# Altium footprint library PcbLib.PcbLib: 79 footprints (part 4 of 5)
Each footprint in its own frame and in the unit in brackets; x right, y up, seen from the top. Pads: shape width x height; smd on the part's side, far side on the other; paste and mask are expansions set on the pad; w line width, h text height; cw(c..) or ccw(c..) is an arc to the next point about the centre after c.
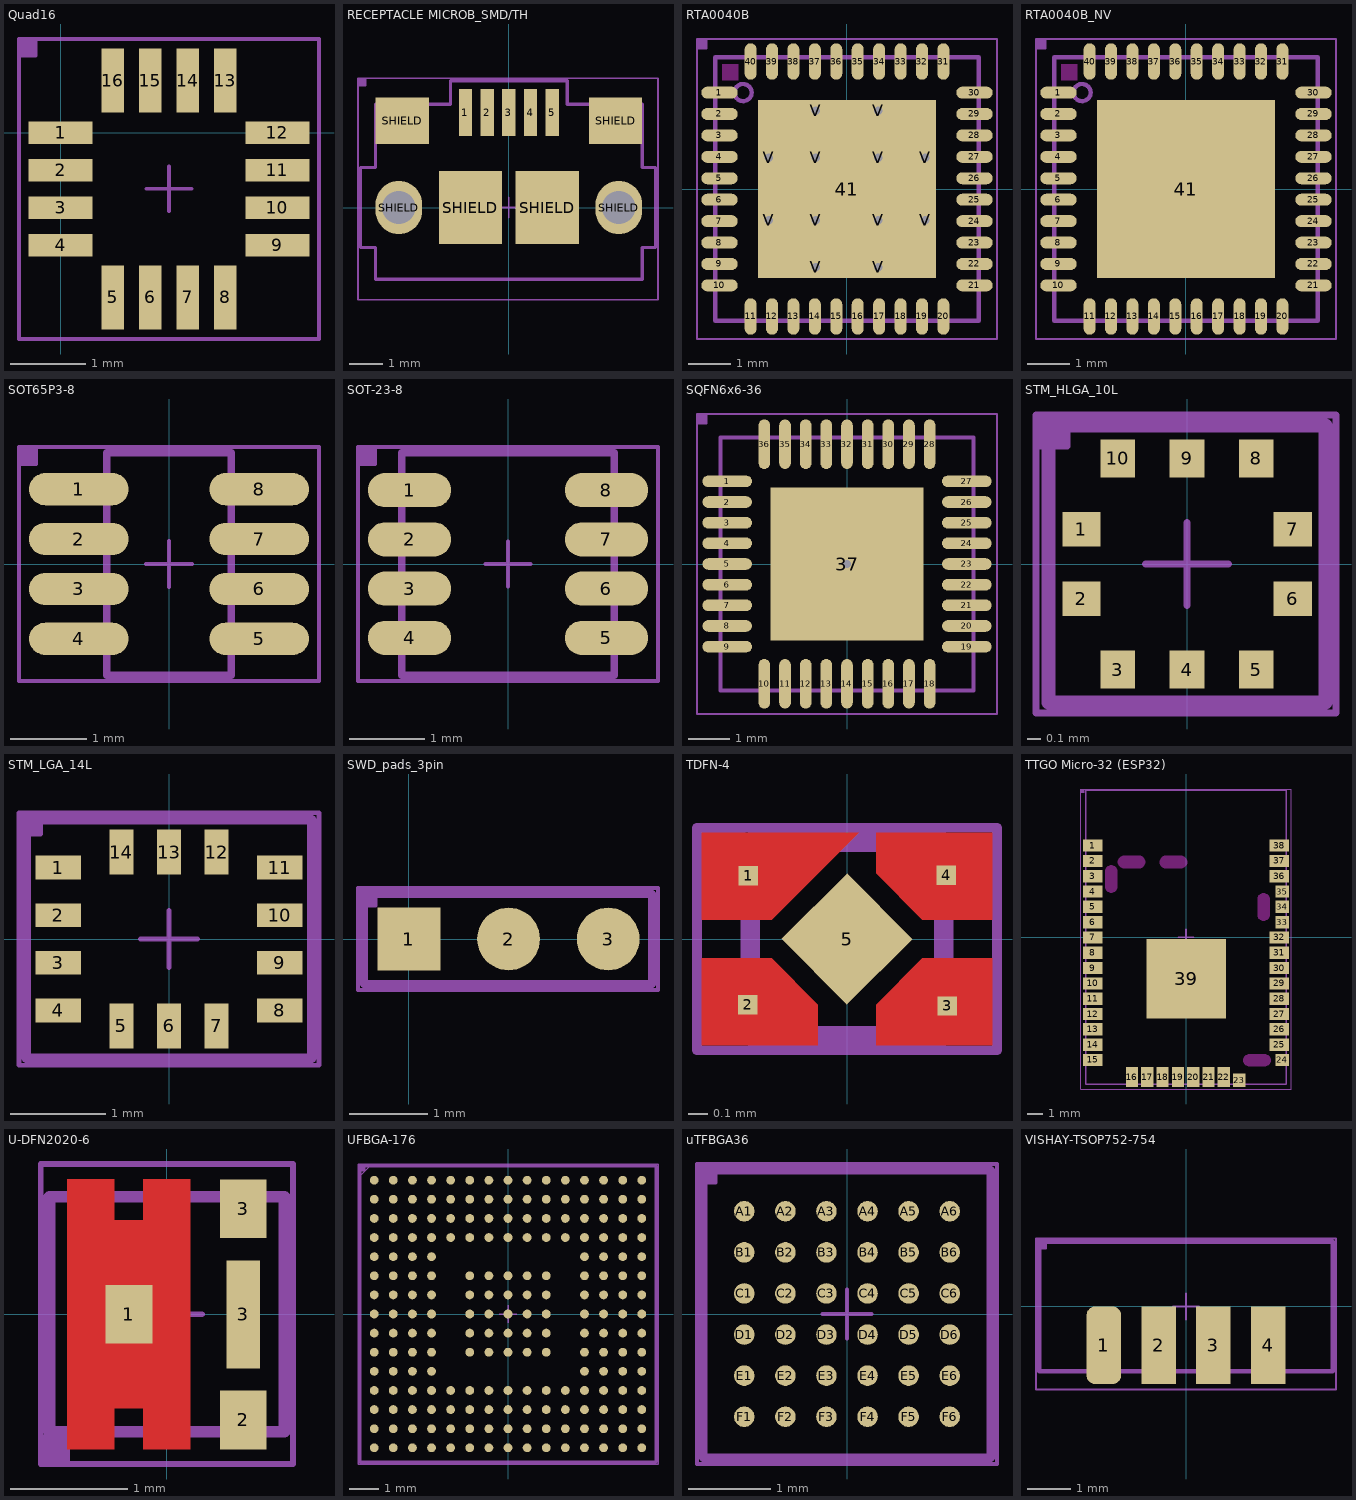
[diagram p3: the footprints below, top view; thin cyan lines are the x and y axes]

## Quad16 [mm]
pads (16):
  rect 0.85x0.3 smd: 1(0,0) 2(0,-0.5) 3(0,-1) 4(0,-1.5) 9(2.9,-1.5) 10(2.9,-1) 11(2.9,-0.5) 12(2.9,0)
  rect 0.3x0.85 smd: 5(0.7,-2.2) 6(1.2,-2.2) 7(1.7,-2.2) 8(2.2,-2.2) 13(2.2,0.7) 14(1.7,0.7) 15(1.2,0.7) 16(0.7,0.7)
TopCourtyard:
  region: -0.555,1.255 -0.555,1.03 -0.33,1.03 -0.33,1.255
  lines w0.05: -0.555,1.03 -0.33,1.03 -0.33,1.255 ; 1.15,-0.745 1.75,-0.745 ; 1.45,-1.045 1.45,-0.445 ; -0.555,-2.755 -0.555,1.255 3.455,1.255 3.455,-2.755 -0.555,-2.755

## RECEPTACLE MICROB_SMD/TH [mm]
pads (11):
  rect 0.4x1.4 smd paste+0 mask+0.05: 1(-1.3,2.85) 2(-0.65,2.85) 3(0,2.85) 4(0.65,2.85) 5(1.3,2.85)
  oval 1.4x1.6 hole 1 paste-1 mask+0.1: SHIELD(-3.3,0) SHIELD(3.3,0)
  rect 1.6x1.4 smd paste+0 mask+0.05: SHIELD(-3.2,2.6) SHIELD(3.2,2.6)
  rect 1.9x2.2 smd paste+0 mask-0.1: SHIELD(-1.15,0) SHIELD(1.15,0)
TopBody:
  lines w0.1: -4.45,-1.2 -4,-1.2 -4,-2.15 4,-2.15 4,-1.2 4.4,-1.2 4.4,1.2 4,1.2 4,3.1 1.75,3.1 1.75,3.8 -1.75,3.8 -1.75,3.1 -4,3.1 -4,1.2 -4.45,1.2 -4.45,-1.2
TopCourtyard:
  region: -4.525,3.875 -4.525,3.65 -4.3,3.65 -4.3,3.875
  lines w0.05: -4.525,3.65 -4.3,3.65 -4.3,3.875 ; -0.3,0 0.3,0 ; 0,-0.3 0,0.3 ; -4.525,-2.765 4.475,-2.765 4.475,3.875 -4.525,3.875 -4.525,-2.765
3D body "10118193-0001lfc.stp": height 3.13, standoff -0.76, extent -4,-2.739 3.857,3.103

## RTA0040B [mm]
pads (53):
  oval 0.85x0.28 smd paste-0.025 mask+0.07: 1(-2.975,2.25) 2(-2.975,1.75) 3(-2.975,1.25) 4(-2.975,0.75) 5(-2.975,0.25) 6(-2.975,-0.25) 7(-2.975,-0.75) 8(-2.975,-1.25) 9(-2.975,-1.75) 10(-2.975,-2.25) 21(2.975,-2.25) 22(2.975,-1.75) 23(2.975,-1.25) 24(2.975,-0.75) 25(2.975,-0.25) 26(2.975,0.25) 27(2.975,0.75) 28(2.975,1.25) 29(2.975,1.75) 30(2.975,2.25)
  oval 0.28x0.85 smd paste-0.025 mask+0.07: 11(-2.25,-2.975) 12(-1.75,-2.975) 13(-1.25,-2.975) 14(-0.75,-2.975) 15(-0.25,-2.975) 16(0.25,-2.975) 17(0.75,-2.975) 18(1.25,-2.975) 19(1.75,-2.975) 20(2.25,-2.975) 31(2.25,2.975) 32(1.75,2.975) 33(1.25,2.975) 34(0.75,2.975) 35(0.25,2.975) 36(-0.25,2.975) 37(-0.75,2.975) 38(-1.25,2.975) 39(-1.75,2.975) 40(-2.25,2.975)
  rect 4.15x4.15 smd paste-2.08 mask+0: 41(0,0)
  round 0.5 hole 0.2 mask+0: V(-1.825,-0.725) V(-1.825,0.725) V(-0.725,-1.825) V(-0.725,-0.725) V(-0.725,0.725) V(-0.725,1.825) V(0.725,-1.825) V(0.725,-0.725) V(0.725,0.725) V(0.725,1.825) V(1.825,-0.725) V(1.825,0.725)
Top Layer keep-out:
  rectangle: -2.918,2.535 -2.535,2.918
Top Paste:
  region: -2.025,0.575 -2.025,-0.575 -0.875,-0.575 -0.875,0.575
  region: -2.025,-0.875 -2.025,-2.025 -0.875,-2.025 -0.875,-0.875
  region: -2.025,2.025 -2.025,0.875 -0.875,0.875 -0.875,2.025
  region: 0.875,0.575 0.875,-0.575 2.025,-0.575 2.025,0.575
  region: 0.875,-0.875 0.875,-2.025 2.025,-2.025 2.025,-0.875
  region: 0.875,2.025 0.875,0.875 2.025,0.875 2.025,2.025
  region: -0.575,2.025 -0.575,0.875 0.575,0.875 0.575,2.025
  region: -0.575,-0.875 -0.575,-2.025 0.575,-2.025 0.575,-0.875
  region: -0.575,0.575 -0.575,-0.575 0.575,-0.575 0.575,0.575
TopBody:
  circle w0.1: c-2.425,2.25 r0.2
  lines w0.1: -3.075,-3.075 -3.075,3.075 3.075,3.075 3.075,-3.075 -3.075,-3.075
TopCourtyard:
  region: -3.5,3.5 -3.5,3.275 -3.275,3.275 -3.275,3.5
  lines w0.05: -3.5,3.275 -3.275,3.275 -3.275,3.5 ; -0.3,0 0.3,0 ; 0,-0.3 0,0.3 ; -3.5,-3.5 3.5,-3.5 3.5,3.5 -3.5,3.5 -3.5,-3.5
3D body "EX.STEP": height 0.74, standoff 0.01, extent -1.5,-1.5 1.5,1.5
3D body "RTA0040B.stp": height 1, standoff 0, extent -3,-3 3,3

## RTA0040B_NV [mm]
pads (41):
  oval 0.85x0.28 smd paste-0.025 mask+0.07: 1(-2.975,2.25) 2(-2.975,1.75) 3(-2.975,1.25) 4(-2.975,0.75) 5(-2.975,0.25) 6(-2.975,-0.25) 7(-2.975,-0.75) 8(-2.975,-1.25) 9(-2.975,-1.75) 10(-2.975,-2.25) 21(2.975,-2.25) 22(2.975,-1.75) 23(2.975,-1.25) 24(2.975,-0.75) 25(2.975,-0.25) 26(2.975,0.25) 27(2.975,0.75) 28(2.975,1.25) 29(2.975,1.75) 30(2.975,2.25)
  oval 0.28x0.85 smd paste-0.025 mask+0.07: 11(-2.25,-2.975) 12(-1.75,-2.975) 13(-1.25,-2.975) 14(-0.75,-2.975) 15(-0.25,-2.975) 16(0.25,-2.975) 17(0.75,-2.975) 18(1.25,-2.975) 19(1.75,-2.975) 20(2.25,-2.975) 31(2.25,2.975) 32(1.75,2.975) 33(1.25,2.975) 34(0.75,2.975) 35(0.25,2.975) 36(-0.25,2.975) 37(-0.75,2.975) 38(-1.25,2.975) 39(-1.75,2.975) 40(-2.25,2.975)
  rect 4.15x4.15 smd paste-2.08 mask+0: 41(0,0)
Top Layer keep-out:
  rectangle: -2.918,2.535 -2.535,2.918
Top Paste:
  region: -0.575,0.575 -0.575,-0.575 0.575,-0.575 0.575,0.575
  region: -0.575,-0.875 -0.575,-2.025 0.575,-2.025 0.575,-0.875
  region: -0.575,2.025 -0.575,0.875 0.575,0.875 0.575,2.025
  region: 0.875,2.025 0.875,0.875 2.025,0.875 2.025,2.025
  region: 0.875,-0.875 0.875,-2.025 2.025,-2.025 2.025,-0.875
  region: 0.875,0.575 0.875,-0.575 2.025,-0.575 2.025,0.575
  region: -2.025,2.025 -2.025,0.875 -0.875,0.875 -0.875,2.025
  region: -2.025,-0.875 -2.025,-2.025 -0.875,-2.025 -0.875,-0.875
  region: -2.025,0.575 -2.025,-0.575 -0.875,-0.575 -0.875,0.575
TopBody:
  circle w0.1: c-2.425,2.25 r0.2
  lines w0.1: -3.075,-3.075 -3.075,3.075 3.075,3.075 3.075,-3.075 -3.075,-3.075
TopCourtyard:
  region: -3.5,3.5 -3.5,3.275 -3.275,3.275 -3.275,3.5
  lines w0.05: -3.5,3.275 -3.275,3.275 -3.275,3.5 ; -0.3,0 0.3,0 ; 0,-0.3 0,0.3 ; -3.5,-3.5 3.5,-3.5 3.5,3.5 -3.5,3.5 -3.5,-3.5
3D body "RTA0040B.stp": height 1, standoff 0, extent -3,-3 3,3

## SOT65P3-8 [mm]
pads (8):
  oval 1.3x0.42 smd: 1(-1.175,0.975) 2(-1.175,0.325) 3(-1.175,-0.325) 4(-1.175,-0.975) 5(1.175,-0.975) 6(1.175,-0.325) 7(1.175,0.325) 8(1.175,0.975)
TopBody:
  lines w0.1: -0.813,-1.45 -0.813,1.45 0.813,1.45 0.813,-1.45 -0.813,-1.45
TopCourtyard:
  region: -1.955,1.525 -1.955,1.3 -1.73,1.3 -1.73,1.525
  lines w0.05: -1.955,1.3 -1.73,1.3 -1.73,1.525 ; -0.3,0 0.3,0 ; 0,-0.3 0,0.3 ; -1.955,-1.525 -1.955,1.525 1.955,1.525 1.955,-1.525 -1.955,-1.525
3D body: height 1.25, standoff 0, extent -0.813,-1.45 0.813,1.45

## SOT-23-8 [mm]
pads (8):
  oval 1.1x0.45 smd: 1(-1.3,0.975) 2(-1.3,0.325) 3(-1.3,-0.325) 4(-1.3,-0.975) 5(1.3,-0.975) 6(1.3,-0.325) 7(1.3,0.325) 8(1.3,0.975)
TopBody:
  lines w0.1: -1.4,-1.47 1.4,-1.47 1.4,1.47 -1.4,1.47 -1.4,-1.47
TopCourtyard:
  region: -1.98,1.545 -1.98,1.32 -1.755,1.32 -1.755,1.545
  lines w0.05: -1.98,1.32 -1.755,1.32 -1.755,1.545 ; -0.3,0 0.3,0 ; 0,-0.3 0,0.3 ; -1.98,-1.545 -1.98,1.545 1.98,1.545 1.98,-1.545 -1.98,-1.545
3D body "User Library-sot238.STEP": height 1.2, standoff 0, extent -1.4,-1.47 1.4,1.47

## SQFN6x6-36 [mm]
height 0.9
pads (37):
  oval 1.2x0.28 smd: 1(-2.9,2) 2(-2.9,1.5) 3(-2.9,1) 4(-2.9,0.5) 5(-2.9,0) 6(-2.9,-0.5) 7(-2.9,-1) 8(-2.9,-1.5) 9(-2.9,-2) 19(2.9,-2) 20(2.9,-1.5) 21(2.9,-1) 22(2.9,-0.5) 23(2.9,0) 24(2.9,0.5) 25(2.9,1) 26(2.9,1.5) 27(2.9,2)
  oval 0.28x1.2 smd: 10(-2,-2.9) 11(-1.5,-2.9) 12(-1,-2.9) 13(-0.5,-2.9) 14(0,-2.9) 15(0.5,-2.9) 16(1,-2.9) 17(1.5,-2.9) 18(2,-2.9) 28(2,2.9) 29(1.5,2.9) 30(1,2.9) 31(0.5,2.9) 32(0,2.9) 33(-0.5,2.9) 34(-1,2.9) 35(-1.5,2.9) 36(-2,2.9)
  rect 3.7x3.7 smd paste-5: 37(0,0)
via 0,0 diameter 0.5 hole 0.2
Top Paste:
  region: -0.7,-0.5 -0.7,0.5 -1.6,0.5 -1.6,-0.5
  region: 0.5,-0.7 -0.5,-0.7 -0.5,-1.6 0.5,-1.6
  region: 0.7,0.5 0.7,-0.5 1.6,-0.5 1.6,0.5
  region: -0.7,-1.6 -0.7,-0.7 -1.6,-0.7 -1.6,-1.6
  region: 1.6,-0.7 0.7,-0.7 0.7,-1.6 1.6,-1.6
  region: 0.7,1.6 0.7,0.7 1.6,0.7 1.6,1.6
  rectangle: -0.5,0.7 0.5,1.6
  rectangle: -1.6,0.7 -0.7,1.6
TopBody:
  lines w0.1: -3.06,-3.06 3.06,-3.06 3.06,3.06 -3.06,3.06 -3.06,-3.06
TopCourtyard:
  region: -3.63,3.63 -3.63,3.405 -3.405,3.405 -3.405,3.63
  lines w0.05: -3.63,3.405 -3.405,3.405 -3.405,3.63 ; -0.3,0 0.3,0 ; 0,-0.3 0,0.3 ; -3.63,-3.63 3.63,-3.63 3.63,3.63 -3.63,3.63 -3.63,-3.63
3D body "SQFN-36 6x6.STEP": height 0.8, standoff 0, extent -3.06,-3.06 3.06,3.06

## STM_HLGA_10L [mm]
height 0.73
pads (10):
  rect 0.275x0.25 smd: 1(-0.762,0.25) 2(-0.762,-0.25) 6(0.763,-0.25) 7(0.763,0.25)
  rect 0.25x0.275 smd: 3(-0.5,-0.762) 4(0,-0.762) 5(0.5,-0.762) 8(0.5,0.762) 9(0,0.762) 10(-0.5,0.762)
TopBody:
  lines w0.1: -1,-1 1,-1 1,1 -1,1 -1,-1
TopCourtyard:
  region: -1.09,1.075 -1.09,0.85 -0.865,0.85 -0.865,1.075
  lines w0.05: -1.09,0.85 -0.865,0.85 -0.865,1.075 ; -0.3,0 0.3,0 ; 0,-0.3 0,0.3 ; -1.09,-1.075 1.075,-1.075 1.075,1.075 -1.09,1.075 -1.09,-1.075
3D body: height 0.81, standoff 0, extent -0.22,-0.76 0.69,0.15
3D body: height 0.81, standoff 0.8, extent -0.921,0.721 -0.721,0.92
3D body: height 0.8, standoff 0, extent -1,-1 1,1

## STM_LGA_14L [mm]
height 0.86
pads (14):
  rect 0.475x0.25 smd: 1(-1.162,0.75) 2(-1.162,0.25) 3(-1.162,-0.25) 4(-1.162,-0.75) 8(1.162,-0.75) 9(1.162,-0.25) 10(1.162,0.25) 11(1.162,0.75)
  rect 0.25x0.475 smd: 5(-0.5,-0.913) 6(0,-0.913) 7(0.5,-0.913) 12(0.5,0.913) 13(0,0.913) 14(-0.5,0.913)
TopBody:
  lines w0.1: -1.5,-1.25 1.5,-1.25 1.5,1.25 -1.5,1.25 -1.5,-1.25
TopCourtyard:
  region: -1.575,1.325 -1.575,1.1 -1.35,1.1 -1.35,1.325
  lines w0.05: -1.575,1.1 -1.35,1.1 -1.35,1.325 ; -0.3,0 0.3,0 ; 0,-0.3 0,0.3 ; -1.575,-1.325 1.575,-1.325 1.575,1.325 -1.575,1.325 -1.575,-1.325
3D body: height 0.87, standoff 0.86, extent -1.321,0.671 -0.921,1.069
3D body: height 0.86, standoff 0, extent -1.5,-1.25 1.5,1.25

## SWD_pads_3pin [mm]
pads (3):
  rect 0.8x0.8 smd: 1(0,0)
  round 0.8 smd: 2(1.27,0) 3(2.54,0)
TopBody:
  lines w0.1: -0.575,-0.575 -0.575,0.575 3.1,0.575 3.1,-0.575 -0.575,-0.575
TopCourtyard:
  region: -0.65,0.65 -0.65,0.425 -0.425,0.425 -0.425,0.65
  lines w0.05: -0.65,0.425 -0.425,0.425 -0.425,0.65 ; 0.97,0 1.57,0 ; 1.27,-0.3 1.27,0.3 ; -0.65,-0.65 -0.65,0.65 3.175,0.65 3.175,-0.65 -0.65,-0.65

## TDFN-4 [mm]
height 0.55
pads (5):
  rect 0.1x0.1 smd paste+0 mask+0: 1(-0.51,0.327) 2(-0.513,-0.339) 3(0.518,-0.346) 4(0.512,0.329)
  rect 0.48x0.48 smd rot 135 paste+0 mask+0.05: 5(0,0)
Top Layer:
  region: -0.75,0.1 -0.75,0.55 0.06,0.55 -0.39,0.1
  region: 0.75,0.1 0.75,0.55 0.15,0.55 0.15,0.34 0.39,0.1
  region: 0.75,-0.1 0.75,-0.55 0.15,-0.55 0.15,-0.34 0.39,-0.1
  region: -0.75,-0.1 -0.75,-0.55 -0.15,-0.55 -0.15,-0.34 -0.39,-0.1
Top Paste:
  region: -0.43,0.2 -0.18,0.45 -0.65,0.45 -0.65,0.2
  region: -0.43,-0.2 -0.25,-0.375 -0.25,-0.45 -0.65,-0.45 -0.65,-0.2
  region: 0.43,0.2 0.25,0.375 0.25,0.45 0.65,0.45 0.65,0.2
  region: 0.43,-0.2 0.25,-0.375 0.25,-0.45 0.65,-0.45 0.65,-0.2
Top Solder:
  region: -0.43,0.2 -0.173,0.45 -0.65,0.45 -0.65,0.2
  region: 0.43,0.2 0.25,0.375 0.25,0.45 0.65,0.45 0.65,0.2
  region: 0.43,-0.2 0.25,-0.375 0.25,-0.45 0.65,-0.45 0.65,-0.2
  region: -0.43,-0.2 -0.25,-0.375 -0.25,-0.45 -0.65,-0.45 -0.65,-0.2
TopBody:
  lines w0.1: -0.5,-0.5 0.5,-0.5 0.5,0.5 -0.5,0.5 -0.5,-0.5
TopCourtyard:
  region: -0.775,0.575 -0.775,0.35 -0.55,0.35 -0.55,0.575
  lines w0.05: -0.55,0.35 -0.55,0.575 -0.55,0.35 ; -0.55,0.35 -0.775,0.35 -0.55,0.35 ; -0.775,-0.575 0.775,-0.575 0.775,0.575 -0.775,0.575 -0.775,-0.575
3D body: height 0.56, standoff 0.55, extent -0.421,0.221 -0.221,0.42
3D body: height 0.55, standoff 0, extent -0.5,-0.5 0.5,0.5

## TTGO Micro-32 (ESP32) [mm]
height 2.8
pads (39):
  rect 1.3x0.8 smd: 1(-6.09,5.98) 2(-6.09,4.98) 3(-6.09,3.98) 4(-6.09,2.98) 5(-6.09,1.98) 6(-6.09,0.98) 7(-6.09,-0.02) 8(-6.09,-1.02) 9(-6.09,-2.02) 10(-6.09,-3.02) 11(-6.09,-4.02) 12(-6.09,-5.02) 13(-6.09,-6.02) 14(-6.09,-7.02) 15(-6.09,-8.02) 25(6.09,-7.02) 26(6.09,-6.02) 27(6.09,-5.02) 28(6.09,-4.02) 29(6.09,-3.02) 30(6.09,-2.02) 31(6.09,-1.02) 32(6.09,-0.02) 36(6.09,3.98) 37(6.09,4.98) 38(6.09,5.98)
  rect 0.8x1.3 smd: 16(-3.53,-9.14) 17(-2.53,-9.14) 18(-1.53,-9.14) 19(-0.53,-9.14) 20(0.47,-9.14) 21(1.47,-9.14) 22(2.47,-9.14)
  rect 0.8x0.9 smd: 23(3.47,-9.34)
  rect 0.9x0.8 smd: 24(6.29,-8.02) 33(6.29,0.98) 34(6.29,1.98) 35(6.29,2.98)
  rect 5.2x5.2 smd: 39(0.005,-2.715)
Top Layer keep-out:
  region: 5.135,-7.64 4.135,-7.64 4.055,-7.64 3.908,-7.701 3.796,-7.813 3.735,-7.96 3.735,-8.12 3.796,-8.267 3.908,-8.379 4.055,-8.44 4.135,-8.44 5.135,-8.44 5.215,-8.44 5.362,-8.379 5.474,-8.267 5.535,-8.12 5.535,-7.96 5.474,-7.813 5.362,-7.701 5.215,-7.64
  region: 5.47,1.465 5.47,2.465 5.47,2.545 5.409,2.692 5.297,2.804 5.15,2.865 4.99,2.865 4.843,2.804 4.731,2.692 4.67,2.545 4.67,2.465 4.67,1.465 4.67,1.385 4.731,1.238 4.843,1.126 4.99,1.065 5.15,1.065 5.297,1.126 5.409,1.238 5.47,1.385
  region: -4.48,3.29 -4.48,4.29 -4.48,4.37 -4.541,4.517 -4.653,4.629 -4.8,4.69 -4.96,4.69 -5.107,4.629 -5.219,4.517 -5.28,4.37 -5.28,4.29 -5.28,3.29 -5.28,3.21 -5.219,3.063 -5.107,2.951 -4.96,2.89 -4.8,2.89 -4.653,2.951 -4.541,3.063 -4.48,3.21
  region: -4.049,4.507 -3.049,4.507 -2.97,4.507 -2.823,4.567 -2.71,4.68 -2.649,4.827 -2.649,4.986 -2.71,5.133 -2.823,5.246 -2.97,5.307 -3.049,5.307 -4.049,5.307 -4.129,5.307 -4.276,5.246 -4.388,5.133 -4.449,4.986 -4.449,4.827 -4.388,4.68 -4.276,4.567 -4.129,4.507
  region: -1.325,4.505 -0.325,4.505 -0.245,4.505 -0.098,4.566 0.014,4.678 0.075,4.825 0.075,4.985 0.014,5.132 -0.098,5.244 -0.245,5.305 -0.325,5.305 -1.325,5.305 -1.405,5.305 -1.552,5.244 -1.664,5.132 -1.725,4.985 -1.725,4.825 -1.664,4.678 -1.552,4.566 -1.405,4.505
TopBody:
  lines w0.1: -6.55,-9.6 6.55,-9.6 6.55,9.6 -6.55,9.6 -6.55,-9.6
TopCourtyard:
  region: -6.87,9.675 -6.87,9.45 -6.645,9.45 -6.645,9.675
  lines w0.05: -6.87,9.45 -6.645,9.45 -6.645,9.675 ; -6.87,-9.915 -6.87,9.675 6.87,9.675 6.87,-9.915 -6.87,-9.915
  lines w0.1: -0.5,0.005 0,0.005 ; 0,-0.495 0,0.005 ; 0,0.505 0,0.005 ; 0.5,0.005 0,0.005
3D body "TTGO micro-32 3d model.STEP": height 2.8, standoff 0, extent -6.506,-9.47 6.55,9.47

## U-DFN2020-6 [mm]
pads (4):
  rect 0.4x0.5 smd mask+0: 1(-0.325,0)
  rect 0.4x0.5 smd mask+0.102: 2(0.65,-0.9)
  rect 0.285x0.92 smd: 3(0.65,0)
  rect 0.4x0.5 smd: 3(0.65,0.9)
Top Layer:
  region: -0.85,1.15 -0.45,1.15 -0.45,0.8 -0.2,0.8 -0.2,1.15 0.2,1.15 0.2,-1.15 -0.2,-1.15 -0.2,-0.8 -0.45,-0.8 -0.45,-1.15 -0.85,-1.15
Top Paste:
  region: -0.4,-0.4 -0.4,0.4 -0.7,0.4 -0.7,-0.4
  region: 0.1,-0.4 0.1,0.4 -0.2,0.4 -0.2,-0.4
TopBody:
  lines w0.1: -1,-1 -1,1 1,1 1,-1 -1,-1
TopCourtyard:
  region: -1.075,-1.05 -1.075,-1.275 -0.85,-1.275 -0.85,-1.05
  lines w0.05: -1.075,-1.05 -0.85,-1.05 -0.85,-1.275 ; -0.3,0 0.3,0 ; 0,-0.3 0,0.3 ; -1.075,-1.275 1.075,-1.275 1.075,1.28 -1.075,1.28 -1.075,-1.275
3D body "6-VDFN EXPOSED PAD.STEP": height 0.75, standoff 0, extent -1,-1 1,1

## UFBGA-176 [mm]
pads (201):
  round 0.3 smd paste+0 mask+0.051: A1(-4.55,4.55) A2(-3.9,4.55) A3(-3.25,4.55) A4(-2.6,4.55) A5(-1.95,4.55) A6(-1.3,4.55) A7(-0.65,4.55) A8(0,4.55) A9(0.65,4.55) A10(1.3,4.55) A11(1.95,4.55) A12(2.6,4.55) A13(3.25,4.55) A14(3.9,4.55) A15(4.55,4.55) B1(-4.55,3.9) B2(-3.9,3.9) B3(-3.25,3.9) B4(-2.6,3.9) B5(-1.95,3.9) B6(-1.3,3.9) B7(-0.65,3.9) B8(0,3.9) B9(0.65,3.9) B10(1.3,3.9) B11(1.95,3.9) B12(2.6,3.9) B13(3.25,3.9) B14(3.9,3.9) B15(4.55,3.9) C1(-4.55,3.25) C2(-3.9,3.25) C3(-3.25,3.25) C4(-2.6,3.25) C5(-1.95,3.25) C6(-1.3,3.25) C7(-0.65,3.25) C8(0,3.25) C9(0.65,3.25) C10(1.3,3.25) C11(1.95,3.25) C12(2.6,3.25) C13(3.25,3.25) C14(3.9,3.25) C15(4.55,3.25) D1(-4.55,2.6) D2(-3.9,2.6) D3(-3.25,2.6) D4(-2.6,2.6) D5(-1.95,2.6) D6(-1.3,2.6) D7(-0.65,2.6) D8(0,2.6) D9(0.65,2.6) D10(1.3,2.6) D11(1.95,2.6) D12(2.6,2.6) D13(3.25,2.6) D14(3.9,2.6) D15(4.55,2.6) E1(-4.55,1.95) E2(-3.9,1.95) E3(-3.25,1.95) E4(-2.6,1.95) E12(2.6,1.95) E13(3.25,1.95) E14(3.9,1.95) E15(4.55,1.95) F1(-4.55,1.3) F2(-3.9,1.3) F3(-3.25,1.3) F4(-2.6,1.3) F6(-1.3,1.3) F7(-0.65,1.3) F8(0,1.3) F9(0.65,1.3) F10(1.3,1.3) F12(2.6,1.3) F13(3.25,1.3) F14(3.9,1.3) F15(4.55,1.3) G1(-4.55,0.65) G2(-3.9,0.65) G3(-3.25,0.65) G4(-2.6,0.65) G6(-1.3,0.65) G7(-0.65,0.65) G8(0,0.65) G9(0.65,0.65) G10(1.3,0.65) G12(2.6,0.65) G13(3.25,0.65) G14(3.9,0.65) G15(4.55,0.65) H1(-4.55,0) H2(-3.9,0) H3(-3.25,0) H4(-2.6,0) H6(-1.3,0) H7(-0.65,0) H8(0,0) H9(0.65,0) H10(1.3,0) H12(2.6,0) H13(3.25,0) H14(3.9,0) H15(4.55,0) J1(-4.55,-0.65) J2(-3.9,-0.65) J3(-3.25,-0.65) J4(-2.6,-0.65) J6(-1.3,-0.65) J7(-0.65,-0.65) J8(0,-0.65) J9(0.65,-0.65) J10(1.3,-0.65) J12(2.6,-0.65) J13(3.25,-0.65) J14(3.9,-0.65) J15(4.55,-0.65) K1(-4.55,-1.3) K2(-3.9,-1.3) K3(-3.25,-1.3) K4(-2.6,-1.3) K6(-1.3,-1.3) K7(-0.65,-1.3) K8(0,-1.3) K9(0.65,-1.3) K10(1.3,-1.3) K12(2.6,-1.3) K13(3.25,-1.3) K14(3.9,-1.3) K15(4.55,-1.3) L1(-4.55,-1.95) L2(-3.9,-1.95) L3(-3.25,-1.95) L4(-2.6,-1.95) L12(2.6,-1.95) L13(3.25,-1.95) L14(3.9,-1.95) L15(4.55,-1.95) M1(-4.55,-2.6) M2(-3.9,-2.6) M3(-3.25,-2.6) M4(-2.6,-2.6) M5(-1.95,-2.6) M6(-1.3,-2.6) M7(-0.65,-2.6) M8(0,-2.6) M9(0.65,-2.6) M10(1.3,-2.6) M11(1.95,-2.6) M12(2.6,-2.6) M13(3.25,-2.6) M14(3.9,-2.6) M15(4.55,-2.6) N1(-4.55,-3.25) N2(-3.9,-3.25) N3(-3.25,-3.25) N4(-2.6,-3.25) N5(-1.95,-3.25) N6(-1.3,-3.25) N7(-0.65,-3.25) N8(0,-3.25) N9(0.65,-3.25) N10(1.3,-3.25) N11(1.95,-3.25) N12(2.6,-3.25) N13(3.25,-3.25) N14(3.9,-3.25) N15(4.55,-3.25) P1(-4.55,-3.9) P2(-3.9,-3.9) P3(-3.25,-3.9) P4(-2.6,-3.9) P5(-1.95,-3.9) P6(-1.3,-3.9) P7(-0.65,-3.9) P8(0,-3.9) P9(0.65,-3.9) P10(1.3,-3.9) P11(1.95,-3.9) P12(2.6,-3.9) P13(3.25,-3.9) P14(3.9,-3.9) P15(4.55,-3.9) R1(-4.55,-4.55) R2(-3.9,-4.55) R3(-3.25,-4.55) R4(-2.6,-4.55) R5(-1.95,-4.55) R6(-1.3,-4.55) R7(-0.65,-4.55) R8(0,-4.55) R9(0.65,-4.55) R10(1.3,-4.55) R11(1.95,-4.55) R12(2.6,-4.55) R13(3.25,-4.55) R14(3.9,-4.55) R15(4.55,-4.55)
TopBody:
  lines w0.025: -5.025,4.7 -4.7,5.025 ; -5.025,-5.025 -5.025,5.025 5.025,5.025 5.025,-5.025 -5.025,-5.025
  lines w0.1: 5.025,-5.025 -5.025,-5.025 -5.025,5.025 5.025,5.025 5.025,-5.025 ; 5.025,-5.025 5.025,-5.025
TopCourtyard:
  region: -5.1,5.1 -5.1,4.875 -4.875,4.875 -4.875,5.1
  lines w0.05: -5.1,4.875 -4.875,4.875 -4.875,5.1 ; -0.3,0 0.3,0 ; 0,-0.3 0,0.3 ; -5.1,-5.1 5.1,-5.1 5.1,5.1 -5.1,5.1 -5.1,-5.1
3D body "UFBGA-176.stp": height 0.61, standoff 0, extent -5.025,-5.025 5.025,5.025

## uTFBGA36 [mm]
height 0.86
pads (36):
  round 0.25 smd: A1(-1.25,1.25) A2(-0.75,1.25) A3(-0.25,1.25) A4(0.25,1.25) A5(0.75,1.25) A6(1.25,1.25) B1(-1.25,0.75) B2(-0.75,0.75) B3(-0.25,0.75) B4(0.25,0.75) B5(0.75,0.75) B6(1.25,0.75) C1(-1.25,0.25) C2(-0.75,0.25) C3(-0.25,0.25) C4(0.25,0.25) C5(0.75,0.25) C6(1.25,0.25) D1(-1.25,-0.25) D2(-0.75,-0.25) D3(-0.25,-0.25) D4(0.25,-0.25) D5(0.75,-0.25) D6(1.25,-0.25) E1(-1.25,-0.75) E2(-0.75,-0.75) E3(-0.25,-0.75) E4(0.25,-0.75) E5(0.75,-0.75) E6(1.25,-0.75) F1(-1.25,-1.25) F2(-0.75,-1.25) F3(-0.25,-1.25) F4(0.25,-1.25) F5(0.75,-1.25) F6(1.25,-1.25)
TopBody:
  lines w0.1: -1.75,-1.75 1.75,-1.75 1.75,1.75 -1.75,1.75 -1.75,-1.75
TopCourtyard:
  region: -1.825,1.825 -1.825,1.6 -1.6,1.6 -1.6,1.825
  lines w0.05: -1.825,1.6 -1.6,1.6 -1.6,1.825 ; -0.3,0 0.3,0 ; 0,-0.3 0,0.3 ; -1.825,-1.825 1.825,-1.825 1.825,1.825 -1.825,1.825 -1.825,-1.825
3D body: height 0.86, standoff 0, extent -1.75,-1.75 1.75,1.75

## VISHAY-TSOP752-754 [mm]
pads (4):
  rrect50% 0.8x1.8 smd: 1(-1.905,-0.9)
  rect 0.8x1.8 smd: 2(-0.635,-0.9) 3(0.635,-0.9) 4(1.905,-0.9)
TopBody:
  lines w0.1: -3.4,-1.5 -3.4,1.5 3.4,1.5 3.4,-1.5 -3.4,-1.5
TopCourtyard:
  region: -3.475,1.575 -3.475,1.35 -3.25,1.35 -3.25,1.575
  lines w0.05: -3.475,1.35 -3.25,1.35 -3.25,1.575 ; -0.3,0 0.3,0 ; 0,-0.3 0,0.3 ; -3.475,-1.925 -3.475,1.575 3.475,1.575 3.475,-1.925 -3.475,-1.925
3D body "TSOP752-754.STEP": height 2.35, standoff 0, extent -3.4,-1.5 3.4,1.5